# Altium footprint library connectors_USB_ETH.PcbLib: 71 footprints (part 3 of 5)
Each footprint in its own frame and in the unit in brackets; x right, y up, seen from the top. Pads: shape width x height; smd on the part's side, far side on the other; paste and mask are expansions set on the pad; w line width, h text height; cw(c..) or ccw(c..) is an arc to the next point about the centre after c.
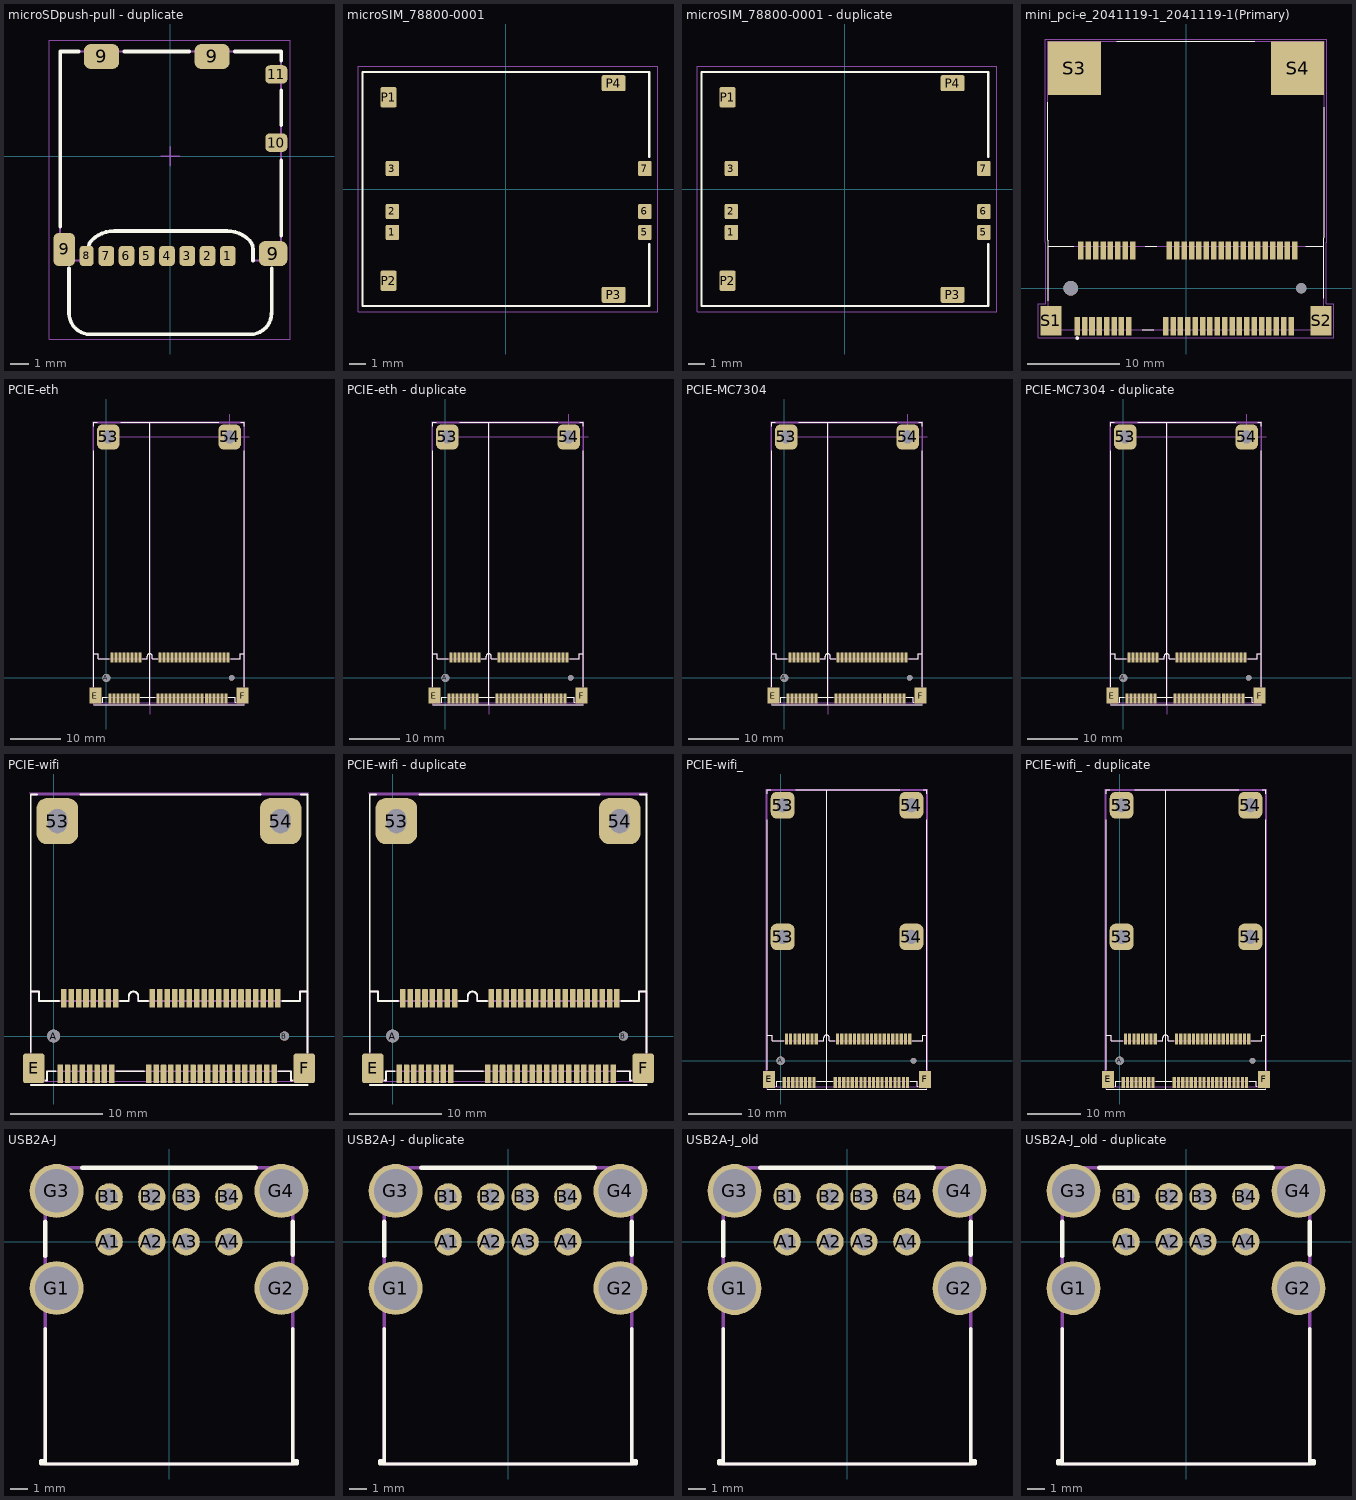
[diagram p2: the footprints below, top view; thin cyan lines are the x and y axes]

## microSDpush-pull - duplicate [mm] "1040310811 molex"
height 1.75
pads (14):
  rrect50% 0.85x1.1 smd: 1(3.123,-5.412) 2(2.023,-5.412) 3(0.923,-5.412) 4(-0.178,-5.412) 5(-1.278,-5.412) 6(-2.378,-5.412) 7(-3.478,-5.412)
  rrect50% 0.75x1.1 smd: 8(-4.543,-5.412)
  rrect50% 1.17x1.8 smd: 9(-5.757,-5.062)
  rrect50% 1.9x1.35 smd: 9(-3.732,5.413) 9(2.268,5.413)
  rrect50% 1.55x1.35 smd: 9(5.583,-5.288)
  rrect50% 1.2x1 smd: 10(5.758,0.738) 11(5.758,4.437)
Top Overlay:
  lines w0.2: -5.983,-3.812 -5.983,5.687 -4.982,5.687 ; -5.5,-8.575 -5.5,-6.1 ; -5.496,-8.525 ccw(c-4.346,-8.525) -4.346,-9.675 ; -4.457,-5.663 -4.457,-5.045 cw(c-3.775,-5.045) -4.257,-4.563 cw(c-3.05,-5.77) -3.05,-4.063 3.085,-4.063 cw(c3.085,-5.77) 4.293,-4.563 cw(c3.81,-5.045) 4.493,-5.045 4.493,-5.663 ; -4.4,-9.675 4.346,-9.675 ccw(c4.346,-8.525) 5.496,-8.525 ; -2.482,5.687 1.018,5.687 ; 3.518,5.687 6.018,5.687 6.018,5.188 ; 5.5,-8.575 5.5,-6.1 ; 6.018,-4.312 6.018,-0.212 ; 6.018,1.688 6.018,3.588
Mechanical 13:
  lines w0.1: -5.983,-5.663 -5.983,5.687 6.018,5.687 6.018,-5.663 ; -5.957,-5.663 -4.457,-5.663 -4.457,-5.045 cw(c-3.775,-5.045) -4.257,-4.563 cw(c-3.05,-5.77) -3.05,-4.063 3.11,-4.063 ; 3.085,-4.063 cw(c3.085,-5.77) 4.293,-4.563 cw(c3.81,-5.045) 4.493,-5.045 4.493,-5.663 5.993,-5.663
Mechanical 15:
  lines w0.05: -6.582,-9.925 -6.582,6.288 6.518,6.288 6.518,-9.925 -6.582,-9.925
  lines w0.1: -0.5,0 0.5,0 ; 0,-0.5 0,0.5
3D body "1040310811.stp": height 1.44, standoff -0.01, extent -5.957,-5.663 5.993,5.738

## microSIM_78800-0001 [mm] "MOLEX_78800-0001"
pads (10):
  rrect20% 0.8x0.9 smd: 1(-6.71,-2.57) 2(-6.71,-1.33) 3(-6.71,1.21) 5(8.23,-2.57) 6(8.23,-1.33) 7(8.23,1.21)
  rrect20% 0.95x1.2 smd: P1(-6.94,5.425) P2(-6.94,-5.425)
  rrect20% 1.4x0.95 smd: P3(6.37,-6.26) P4(6.37,6.26)
Top Overlay:
  lines w0.127: 8.48,-3.25 8.48,-6.925 -8.48,-6.925 -8.48,6.925 8.48,6.925 8.48,1.9
M1_3D_TOP:
  lines w0.05: -8.75,-7.25 -8.75,7.25 9,7.25 9,-7.25 -8.75,-7.25
3D body "788000001.stp": height 1.5, standoff -0.01, extent -8.48,-6.925 8.48,6.925

## microSIM_78800-0001 - duplicate [mm] "MOLEX_78800-0001"
pads (10):
  rrect20% 0.8x0.9 smd: 1(-6.71,-2.57) 2(-6.71,-1.33) 3(-6.71,1.21) 5(8.23,-2.57) 6(8.23,-1.33) 7(8.23,1.21)
  rrect20% 0.95x1.2 smd: P1(-6.94,5.425) P2(-6.94,-5.425)
  rrect20% 1.4x0.95 smd: P3(6.37,-6.26) P4(6.37,6.26)
Top Overlay:
  lines w0.127: 8.48,-3.25 8.48,-6.925 -8.48,-6.925 -8.48,6.925 8.48,6.925 8.48,1.9
M1_3D_TOP:
  lines w0.05: -8.75,-7.25 9,-7.25 9,7.25 -8.75,7.25 -8.75,-7.25
3D body "788000001.stp": height 1.5, standoff -0.01, extent -8.48,-6.925 8.48,6.925

## mini_pci-e_2041119-1_2041119-1(Primary) [mm] "2041119-1_2041119-1(Primary)"
pads (58):
  rect 0.6x2 smd: 1(-11.8,-4.1) 2(-11.4,4.1) 3(-11,-4.1) 4(-10.6,4.1) 5(-10.2,-4.1) 6(-9.8,4.1) 7(-9.4,-4.1) 8(-9,4.1) 9(-8.6,-4.1) 10(-8.2,4.1) 11(-7.8,-4.1) 12(-7.4,4.1) 13(-7,-4.1) 14(-6.6,4.1) 15(-6.2,-4.1) 16(-5.8,4.1) 17(-2.2,-4.1) 18(-1.8,4.1) 19(-1.4,-4.1) 20(-1,4.1) 21(-0.6,-4.1) 22(-0.2,4.1) 23(0.2,-4.1) 24(0.6,4.1) 25(1,-4.1) 26(1.4,4.1) 27(1.8,-4.1) 28(2.2,4.1) 29(2.6,-4.1) 30(3,4.1) 31(3.4,-4.1) 32(3.8,4.1) 33(4.2,-4.1) 34(4.6,4.1) 35(5,-4.1) 36(5.4,4.1) 37(5.8,-4.1) 38(6.2,4.1) 39(6.6,-4.1) 40(7,4.1) 41(7.4,-4.1) 42(7.8,4.1) 43(8.2,-4.1) 44(8.6,4.1) 45(9,-4.1) 46(9.4,4.1) 47(9.8,-4.1) 48(10.2,4.1) 49(10.6,-4.1) 50(11,4.1) 51(11.4,-4.1) 52(11.8,4.1)
  round 1.6 hole 1.6 unplated: None(-12.5,0)
  round 1.1 hole 1.1 unplated: None(12.5,0)
  rect 2.3x3.2 smd: S1(-14.65,-3.5) S2(14.65,-3.5)
  rect 5.8x5.8 smd: S3(-12.1,23.9) S4(12.1,23.9)
Top Overlay:
  circle w0.2: c-11.8,-5.4 r0.1
  lines w0.127: -15,20.2 -15,5.2 -14.95,5.15 -14.95,4.58 ; -14.95,-1.35 -14.95,4.58 ; -12.2,4.58 -14.95,4.58 ; -7.5,26.8 7.45,26.8 ; -4.75,-4.51 -3.5,-4.51 ; -4.4,4.58 -3.15,4.58 ; 13,4.58 14.95,4.58 ; 14.95,-1.1 14.95,4.58 ; 15,19.65 15,5.55 14.95,5.5 14.95,4.58
M1_3D_TOP:
  lines w0.05: -16.05,-5.35 -16.05,-1.65 -15.2,-1.65 -15.2,5 -15.25,5 -15.25,27.05 15.25,27.05 15.25,5 15.2,5 15.2,-1.65 16.05,-1.65 16.05,-5.35 -16.05,-5.35
  lines w0.127: -15,5.6 -15,26.8 15,26.8 15,5.6 ; -14.95,-4.51 14.95,-4.51 14.95,4.58 -14.95,4.58 -14.95,-4.51

## PCIE-eth [mil]
height 1
pads (60):
  rect 23.6x80 smd mask+5.4: 1(27.6,-161) 2(43.3,161) 3(59.1,-161) 4(74.8,161) 5(90.6,-161) 6(106.3,161) 7(122,-161) 8(137.8,161) 9(153.5,-161) 10(169.3,161) 11(185,-161) 12(200.8,161) 13(216.5,-161) 14(232.3,161) 15(248,-161) 16(263.8,161) 17(405.5,-161) 18(421.3,161) 19(437,-161) 20(452.8,161) 21(468.5,-161) 22(484.3,161) 23(500,-161) 24(515.7,161) 25(531.5,-161) 26(547.2,161) 27(563,-161) 28(578.7,161) 29(594.5,-161) 30(610.2,161) 31(626,-161) 32(641.7,161) 33(657.5,-161) 34(673.2,161) 35(689,-161) 36(704.7,161) 37(720,-161) 38(736.2,161) 39(752,-161) 40(767.7,161) 41(785,-161) 42(799.2,161) 43(815,-161) 44(830.7,161) 45(846.5,-161) 46(862.2,161) 47(878,-161) 48(893.7,161) 49(909.4,-161) 50(925.2,161) 51(940.9,-161) 52(956.7,161)
  rrect50% 177.17x196.85 hole 82.68 slot 102.36 at 90 deg mask+5: 53(15.75,1891.73) 54(968.5,1891.73)
  round 63 hole 63 mask+5: A(0,0)
  round 43 hole 43 mask+5: B(984.25,0)
  rect 90.55x126 smd mask+5: E(-85,-138) F(1069,-138)
  round 0 all layers, no hole: K(16,1892) L(969,1892)
Top Overlay:
  lines w7.87: 320.55,150.55 320.55,171 ; 360.55,150 360.55,171
  lines w8: -98,-209 1083,-209 ; -98,-68 -98,1785 ; -98,190 -62,190 -62,150 22,150 ; -98,1976.38 -98,2006 -70.87,2006 ; -33,-190 -29,-190 -29,-150 7,-150 ; 114.17,2006 881.89,2006 ; 267,-150 386,-150 ; 283,150 320,150 ; 320.55,171 cw(c340.55,170.2) 360.55,171 ; 341,-209 341,2003.94 ; 360.55,150 402,150 ; 959,-150 1012,-150 1012,-190 1016,-190 ; 976,150 1051,150 1051,190 1083,190 ; 1055.12,2006 1083,2006 1083,1976.38 ; 1083,-70 1083,1785
M1_3D_TOP:
  circle w8: c16,1892 r51.01
  circle w8: c968.5,1892 r51.01
  lines w1: -45,1892 1120,1892 ; 16,1827 16,1955 ; 968.5,1827 968.5,1955 ; 969,1802 969,2072 ; -104,-193 1088,-193 1088,2012 -104,2012 -104,-193
  lines w4: 341,-283 340.98,2003.94
  lines w8: -98,2006 1083,2006 ; 27,-190 27,-150 ; 43,151 43,197 ; 59,-189 59,-151 ; 75,151 75,197 ; 91,-189 91,-151 ; 106,150 106,197 ; 122,-189 122,-150 ; 138,150 138,197 ; 153,-190 153,-150 ; 169,150 169,197 ; 185,-190 185,-150 ; 201,150 201,197 ; 216,-189 216,-150 ; 232,150 232,197 ; 248,-189 248,-150 ; 264,150 264,197 ; 406,-189 406,-150 ; 421,150 421,197 ; 437,-189 437,-150 ; 453,150 453,197 ; 468,-189 468,-150 ; 484,150 484,197 ; 500,-189 500,-150 ; 516,150 516,197 ; 532,-190 532,-150 ; 547,150 547,197 ; 563,-189 563,-150 ; 579,151 579,197 ; 595,-189 595,-150 ; 610,150 610,197 ; 626,-189 626,-150 ; 642,151 642,197 ; 658,-190 658,-150 ; 673,150 673,197 ; 689,-189 689,-151 ; 704,150 704,197 ; 720,-189 720,-150 ; 736,150 736,197 ; 752,-189 752,-150 ; 768,150 768,197 ; 785,-189 785,-150 ; 799,150 799,197 ; 815,-189 815,-150 ; 831,150 831,197 ; 846,-189 846,-150 ; 862,150 862,197 ; 878,-189 878,-150 ; 894,150 894,197 ; 909,-189 909,-150 ; 925,150 925,197 ; 941,-189 941,-150 ; 956,150 956,197 ; -98,-209 -98,2003.94 1083,2003.94 1083,-209 -98,-209 ; -98,-190 -29,-190 -29,-150 1012,-150 1012,-190 1083,-190 1083,190 1051,190 1051,150 360,150 360,170 ccw(c340,170.1) 320,170 320,150 -62,150 -62,190 -98,190 -98,-190
3D body "PCI Express Mini Card (Full-Mini Card).step": height 291.34, standoff 104.33, extent -98.42,0 1082.68,2005.91
3D body: height 157.87, standoff 0.39, extent -52.81,1823.13 84.9,1960.88
3D body "c-2041119-1-c-3d.stp": height 159.45, standoff -23.62, extent -96.45,-181.1 1080.71,176.77
3D body "emile_maurin_394112X4.stp": height 270.83, standoff 47.24, extent -62.99,1813 94.49,1970.48
3D body "emile_maurin_394112X4.stp": height 98.43, standoff -125.16, extent -62.73,1813.26 94.75,1970.74
3D body "emile_maurin_394112X4.stp": height 98.43, standoff -125.16, extent 889.77,1813.26 1047.25,1970.74
3D body "emile_maurin_394112X4.stp": height 270.83, standoff 47.24, extent 889.52,1813 1047,1970.48
3D body: height 157.87, standoff 0.39, extent 899.69,1823.13 1037.4,1960.88

## PCIE-eth - duplicate [mil]
height 1
pads (60):
  rect 23.6x80 smd mask+5.4: 1(27.6,-161) 2(43.3,161) 3(59.1,-161) 4(74.8,161) 5(90.6,-161) 6(106.3,161) 7(122,-161) 8(137.8,161) 9(153.5,-161) 10(169.3,161) 11(185,-161) 12(200.8,161) 13(216.5,-161) 14(232.3,161) 15(248,-161) 16(263.8,161) 17(405.5,-161) 18(421.3,161) 19(437,-161) 20(452.8,161) 21(468.5,-161) 22(484.3,161) 23(500,-161) 24(515.7,161) 25(531.5,-161) 26(547.2,161) 27(563,-161) 28(578.7,161) 29(594.5,-161) 30(610.2,161) 31(626,-161) 32(641.7,161) 33(657.5,-161) 34(673.2,161) 35(689,-161) 36(704.7,161) 37(720,-161) 38(736.2,161) 39(752,-161) 40(767.7,161) 41(785,-161) 42(799.2,161) 43(815,-161) 44(830.7,161) 45(846.5,-161) 46(862.2,161) 47(878,-161) 48(893.7,161) 49(909.4,-161) 50(925.2,161) 51(940.9,-161) 52(956.7,161)
  rrect50% 177.17x196.85 hole 82.68 slot 102.36 at 90 deg mask+5: 53(15.75,1891.73) 54(968.5,1891.73)
  round 63 hole 63 mask+5: A(0,0)
  round 43 hole 43 mask+5: B(984.25,0)
  rect 90.55x126 smd mask+5: E(-85,-138) F(1069,-138)
  round 0 all layers, no hole: K(16,1892) L(969,1892)
Top Overlay:
  lines w7.87: 320.55,150.55 320.55,171 ; 360.55,150 360.55,171
  lines w8: -98,-209 1083,-209 ; -98,-68 -98,1785 ; -98,190 -62,190 -62,150 22,150 ; -98,1976.38 -98,2006 -70.87,2006 ; -33,-190 -29,-190 -29,-150 7,-150 ; 114.17,2006 881.89,2006 ; 267,-150 386,-150 ; 283,150 320,150 ; 320.55,171 cw(c340.55,170.2) 360.55,171 ; 341,-209 341,2003.94 ; 360.55,150 402,150 ; 959,-150 1012,-150 1012,-190 1016,-190 ; 976,150 1051,150 1051,190 1083,190 ; 1055.12,2006 1083,2006 1083,1976.38 ; 1083,-70 1083,1785
M1_3D_TOP:
  circle w8: c968.5,1892 r51.01
  circle w8: c16,1892 r51.01
  lines w1: -45,1892 1120,1892 ; 16,1827 16,1955 ; 968.5,1827 968.5,1955 ; 969,1802 969,2072 ; -104,-193 -104,2012 1088,2012 1088,-193 -104,-193
  lines w4: 341,-283 340.98,2003.94
  lines w8: -98,2006 1083,2006 ; 27,-190 27,-150 ; 43,151 43,197 ; 59,-189 59,-151 ; 75,151 75,197 ; 91,-189 91,-151 ; 106,150 106,197 ; 122,-189 122,-150 ; 138,150 138,197 ; 153,-190 153,-150 ; 169,150 169,197 ; 185,-190 185,-150 ; 201,150 201,197 ; 216,-189 216,-150 ; 232,150 232,197 ; 248,-189 248,-150 ; 264,150 264,197 ; 406,-189 406,-150 ; 421,150 421,197 ; 437,-189 437,-150 ; 453,150 453,197 ; 468,-189 468,-150 ; 484,150 484,197 ; 500,-189 500,-150 ; 516,150 516,197 ; 532,-190 532,-150 ; 547,150 547,197 ; 563,-189 563,-150 ; 579,151 579,197 ; 595,-189 595,-150 ; 610,150 610,197 ; 626,-189 626,-150 ; 642,151 642,197 ; 658,-190 658,-150 ; 673,150 673,197 ; 689,-189 689,-151 ; 704,150 704,197 ; 720,-189 720,-150 ; 736,150 736,197 ; 752,-189 752,-150 ; 768,150 768,197 ; 785,-189 785,-150 ; 799,150 799,197 ; 815,-189 815,-150 ; 831,150 831,197 ; 846,-189 846,-150 ; 862,150 862,197 ; 878,-189 878,-150 ; 894,150 894,197 ; 909,-189 909,-150 ; 925,150 925,197 ; 941,-189 941,-150 ; 956,150 956,197 ; -98,-209 1083,-209 1083,2003.94 -98,2003.94 -98,-209 ; -98,-190 -98,190 -62,190 -62,150 320,150 320,170 cw(c340,170.1) 360,170 360,150 1051,150 1051,190 1083,190 1083,-190 1012,-190 1012,-150 -29,-150 -29,-190 -98,-190
3D body: height 157.87, standoff 0.39, extent 899.69,1823.13 1037.4,1960.88
3D body "emile_maurin_394112X4.stp": height 270.83, standoff 47.24, extent 889.52,1813 1047,1970.48
3D body "emile_maurin_394112X4.stp": height 98.43, standoff -125.16, extent 889.77,1813.26 1047.25,1970.74
3D body "emile_maurin_394112X4.stp": height 98.43, standoff -125.16, extent -62.73,1813.26 94.75,1970.74
3D body "emile_maurin_394112X4.stp": height 270.83, standoff 47.24, extent -62.99,1813 94.49,1970.48
3D body "c-2041119-1-c-3d.stp": height 159.45, standoff -23.62, extent -96.45,-181.1 1080.71,176.77
3D body: height 157.87, standoff 0.39, extent -52.81,1823.13 84.9,1960.88
3D body "PCI Express Mini Card (Full-Mini Card).step": height 291.34, standoff 104.33, extent -98.42,0 1082.68,2005.91

## PCIE-MC7304 [mil]
height 1
pads (60):
  rect 23.6x80 smd mask+5.4: 1(27.6,-161) 2(43.3,161) 3(59.1,-161) 4(74.8,161) 5(90.6,-161) 6(106.3,161) 7(122,-161) 8(137.8,161) 9(153.5,-161) 10(169.3,161) 11(185,-161) 12(200.8,161) 13(216.5,-161) 14(232.3,161) 15(248,-161) 16(263.8,161) 17(405.5,-161) 18(421.3,161) 19(437,-161) 20(452.8,161) 21(468.5,-161) 22(484.3,161) 23(500,-161) 24(515.7,161) 25(531.5,-161) 26(547.2,161) 27(563,-161) 28(578.7,161) 29(594.5,-161) 30(610.2,161) 31(626,-161) 32(641.7,161) 33(657.5,-161) 34(673.2,161) 35(689,-161) 36(704.7,161) 37(720,-161) 38(736.2,161) 39(752,-161) 40(767.7,161) 41(785,-161) 42(799.2,161) 43(815,-161) 44(830.7,161) 45(846.5,-161) 46(862.2,161) 47(878,-161) 48(893.7,161) 49(909.4,-161) 50(925.2,161) 51(940.9,-161) 52(956.7,161)
  rrect50% 177.17x196.85 hole 82.68 slot 102.36 at 90 deg mask+5: 53(15.75,1891.73) 54(968.5,1891.73)
  round 63 hole 63 unplated mask+5: A(0,0)
  round 43.31 hole 43.31 unplated mask+5: B(984.25,0)
  rect 90.55x126 smd mask+5: E(-85,-138) F(1069,-138)
  round 0 all layers, no hole: K(16,1892) L(969,1892)
Top Overlay:
  lines w7.87: 320.55,150.55 320.55,171 ; 360.55,150 360.55,171
  lines w8: -98,-209 1083,-209 ; -98,-68 -98,1785 ; -98,190 -62,190 -62,150 22,150 ; -98,1976.38 -98,2006 -70.87,2006 ; -33,-190 -29,-190 -29,-150 7,-150 ; 114.17,2006 881.89,2006 ; 267,-150 386,-150 ; 283,150 320,150 ; 320.55,171 cw(c340.55,170.2) 360.55,171 ; 341,-209 341,2003.94 ; 360.55,150 402,150 ; 959,-150 1012,-150 1012,-190 1016,-190 ; 976,150 1051,150 1051,190 1083,190 ; 1055.12,2006 1083,2006 1083,1976.38 ; 1083,-70 1083,1785
M1_3D_TOP:
  circle w8: c16,1892 r51.01
  circle w8: c968.5,1892 r51.01
  lines w1: -45,1892 1120,1892 ; 16,1827 16,1955 ; 968.5,1827 968.5,1955 ; 969,1802 969,2072 ; -104,-193 1088,-193 1088,2012 -104,2012 -104,-193
  lines w4: 341,-283 340.98,2003.94
  lines w8: -98,2006 1083,2006 ; 27,-190 27,-150 ; 43,151 43,197 ; 59,-189 59,-151 ; 75,151 75,197 ; 91,-189 91,-151 ; 106,150 106,197 ; 122,-189 122,-150 ; 138,150 138,197 ; 153,-190 153,-150 ; 169,150 169,197 ; 185,-190 185,-150 ; 201,150 201,197 ; 216,-189 216,-150 ; 232,150 232,197 ; 248,-189 248,-150 ; 264,150 264,197 ; 406,-189 406,-150 ; 421,150 421,197 ; 437,-189 437,-150 ; 453,150 453,197 ; 468,-189 468,-150 ; 484,150 484,197 ; 500,-189 500,-150 ; 516,150 516,197 ; 532,-190 532,-150 ; 547,150 547,197 ; 563,-189 563,-150 ; 579,151 579,197 ; 595,-189 595,-150 ; 610,150 610,197 ; 626,-189 626,-150 ; 642,151 642,197 ; 658,-190 658,-150 ; 673,150 673,197 ; 689,-189 689,-151 ; 704,150 704,197 ; 720,-189 720,-150 ; 736,150 736,197 ; 752,-189 752,-150 ; 768,150 768,197 ; 785,-189 785,-150 ; 799,150 799,197 ; 815,-189 815,-150 ; 831,150 831,197 ; 846,-189 846,-150 ; 862,150 862,197 ; 878,-189 878,-150 ; 894,150 894,197 ; 909,-189 909,-150 ; 925,150 925,197 ; 941,-189 941,-150 ; 956,150 956,197 ; -98,-209 -98,2003.94 1083,2003.94 1083,-209 -98,-209 ; -98,-190 -29,-190 -29,-150 1012,-150 1012,-190 1083,-190 1083,190 1051,190 1051,150 360,150 360,170 ccw(c340,170.1) 320,170 320,150 -62,150 -62,190 -98,190 -98,-190
3D body: height 157.87, standoff 0.39, extent -52.81,1823.13 84.9,1960.88
3D body "MC7355_Assy_042612.stp": height 265.75, standoff 161.02, extent -96.21,0.27 1080.96,2002.24
3D body "c-2041119-1-c-3d.stp": height 159.45, standoff -23.62, extent -96.45,-181.1 1080.71,176.77
3D body "emile_maurin_394112X4.stp": height 270.83, standoff 47.24, extent -62.99,1813 94.49,1970.48
3D body "emile_maurin_394112X4.stp": height 98.43, standoff -125.16, extent -62.73,1813.26 94.75,1970.74
3D body "emile_maurin_394112X4.stp": height 98.43, standoff -125.16, extent 889.77,1813.26 1047.25,1970.74
3D body "emile_maurin_394112X4.stp": height 270.83, standoff 47.24, extent 889.52,1813 1047,1970.48
3D body: height 157.87, standoff 0.39, extent 899.69,1823.13 1037.4,1960.88

## PCIE-MC7304 - duplicate [mil]
height 1
pads (60):
  rect 23.6x80 smd mask+5.4: 1(27.6,-161) 2(43.3,161) 3(59.1,-161) 4(74.8,161) 5(90.6,-161) 6(106.3,161) 7(122,-161) 8(137.8,161) 9(153.5,-161) 10(169.3,161) 11(185,-161) 12(200.8,161) 13(216.5,-161) 14(232.3,161) 15(248,-161) 16(263.8,161) 17(405.5,-161) 18(421.3,161) 19(437,-161) 20(452.8,161) 21(468.5,-161) 22(484.3,161) 23(500,-161) 24(515.7,161) 25(531.5,-161) 26(547.2,161) 27(563,-161) 28(578.7,161) 29(594.5,-161) 30(610.2,161) 31(626,-161) 32(641.7,161) 33(657.5,-161) 34(673.2,161) 35(689,-161) 36(704.7,161) 37(720,-161) 38(736.2,161) 39(752,-161) 40(767.7,161) 41(785,-161) 42(799.2,161) 43(815,-161) 44(830.7,161) 45(846.5,-161) 46(862.2,161) 47(878,-161) 48(893.7,161) 49(909.4,-161) 50(925.2,161) 51(940.9,-161) 52(956.7,161)
  rrect50% 177.17x196.85 hole 82.68 slot 102.36 at 90 deg mask+5: 53(15.75,1891.73) 54(968.5,1891.73)
  round 63 hole 63 unplated mask+5: A(0,0)
  round 43.31 hole 43.31 unplated mask+5: B(984.25,0)
  rect 90.55x126 smd mask+5: E(-85,-138) F(1069,-138)
  round 0 all layers, no hole: K(16,1892) L(969,1892)
Top Overlay:
  lines w7.87: 320.55,150.55 320.55,171 ; 360.55,150 360.55,171
  lines w8: -98,-209 1083,-209 ; -98,-68 -98,1785 ; -98,190 -62,190 -62,150 22,150 ; -98,1976.38 -98,2006 -70.87,2006 ; -33,-190 -29,-190 -29,-150 7,-150 ; 114.17,2006 881.89,2006 ; 267,-150 386,-150 ; 283,150 320,150 ; 320.55,171 cw(c340.55,170.2) 360.55,171 ; 341,-209 341,2003.94 ; 360.55,150 402,150 ; 959,-150 1012,-150 1012,-190 1016,-190 ; 976,150 1051,150 1051,190 1083,190 ; 1055.12,2006 1083,2006 1083,1976.38 ; 1083,-70 1083,1785
M1_3D_TOP:
  circle w8: c968.5,1892 r51.01
  circle w8: c16,1892 r51.01
  lines w1: -45,1892 1120,1892 ; 16,1827 16,1955 ; 968.5,1827 968.5,1955 ; 969,1802 969,2072 ; -104,-193 -104,2012 1088,2012 1088,-193 -104,-193
  lines w4: 341,-283 340.98,2003.94
  lines w8: -98,2006 1083,2006 ; 27,-190 27,-150 ; 43,151 43,197 ; 59,-189 59,-151 ; 75,151 75,197 ; 91,-189 91,-151 ; 106,150 106,197 ; 122,-189 122,-150 ; 138,150 138,197 ; 153,-190 153,-150 ; 169,150 169,197 ; 185,-190 185,-150 ; 201,150 201,197 ; 216,-189 216,-150 ; 232,150 232,197 ; 248,-189 248,-150 ; 264,150 264,197 ; 406,-189 406,-150 ; 421,150 421,197 ; 437,-189 437,-150 ; 453,150 453,197 ; 468,-189 468,-150 ; 484,150 484,197 ; 500,-189 500,-150 ; 516,150 516,197 ; 532,-190 532,-150 ; 547,150 547,197 ; 563,-189 563,-150 ; 579,151 579,197 ; 595,-189 595,-150 ; 610,150 610,197 ; 626,-189 626,-150 ; 642,151 642,197 ; 658,-190 658,-150 ; 673,150 673,197 ; 689,-189 689,-151 ; 704,150 704,197 ; 720,-189 720,-150 ; 736,150 736,197 ; 752,-189 752,-150 ; 768,150 768,197 ; 785,-189 785,-150 ; 799,150 799,197 ; 815,-189 815,-150 ; 831,150 831,197 ; 846,-189 846,-150 ; 862,150 862,197 ; 878,-189 878,-150 ; 894,150 894,197 ; 909,-189 909,-150 ; 925,150 925,197 ; 941,-189 941,-150 ; 956,150 956,197 ; -98,-209 1083,-209 1083,2003.94 -98,2003.94 -98,-209 ; -98,-190 -98,190 -62,190 -62,150 320,150 320,170 cw(c340,170.1) 360,170 360,150 1051,150 1051,190 1083,190 1083,-190 1012,-190 1012,-150 -29,-150 -29,-190 -98,-190
3D body: height 157.87, standoff 0.39, extent 899.69,1823.13 1037.4,1960.88
3D body "emile_maurin_394112X4.stp": height 270.83, standoff 47.24, extent 889.52,1813 1047,1970.48
3D body "emile_maurin_394112X4.stp": height 98.43, standoff -125.16, extent 889.77,1813.26 1047.25,1970.74
3D body "emile_maurin_394112X4.stp": height 98.43, standoff -125.16, extent -62.73,1813.26 94.75,1970.74
3D body "emile_maurin_394112X4.stp": height 270.83, standoff 47.24, extent -62.99,1813 94.49,1970.48
3D body "c-2041119-1-c-3d.stp": height 159.45, standoff -23.62, extent -96.45,-181.1 1080.71,176.77
3D body "MC7355_Assy_042612.stp": height 265.75, standoff 161.02, extent -96.21,0.27 1080.96,2002.24
3D body: height 157.87, standoff 0.39, extent -52.81,1823.13 84.9,1960.88

## PCIE-wifi [mil]
height 1
pads (58):
  rrect20% 23.6x80 smd mask+5.4: 1(27.6,-161) 2(43.3,161) 3(59.1,-161) 4(74.8,161) 5(90.6,-161) 6(106.3,161) 7(122,-161) 8(137.8,161) 9(153.5,-161) 10(169.3,161) 11(185,-161) 12(200.8,161) 13(216.5,-161) 14(232.3,161) 15(248,-161) 16(263.8,161) 17(405.5,-161) 18(421.3,161) 19(437,-161) 20(452.8,161) 21(468.5,-161) 22(484.3,161) 23(500,-161) 24(515.7,161) 25(531.5,-161) 26(547.2,161) 27(563,-161) 28(578.7,161) 29(594.5,-161) 30(610.2,161) 31(626,-161) 32(641.7,161) 33(657.5,-161) 34(673.2,161) 35(689,-161) 36(704.7,161) 37(720,-161) 38(736.2,161) 39(752,-161) 40(767.7,161) 41(785,-161) 42(799.2,161) 43(815,-161) 44(830.7,161) 45(846.5,-161) 46(862.2,161) 47(878,-161) 48(893.7,161) 49(909.4,-161) 50(925.2,161) 51(940.9,-161) 52(956.7,161)
  rrect50% 177.17x196.85 hole 82.68 slot 102.36 at 90 deg mask+5: 53(15.75,917.32) 54(968.5,917.32)
  round 55.12 hole 55.12 unplated mask+5: A(0,0)
  round 39.37 hole 39.37 unplated mask+5: B(984.25,0)
  rrect20% 90.55x126 smd mask+5: E(-85,-138) F(1069,-138)
Top Overlay:
  lines w7.87: 320.55,150.55 320.55,171 ; 360.55,150 360.55,171
  lines w8: -98,-209 1083,-209 ; -98,-68 -98,1031.5 ; -98,190 -62,190 -62,150 22,150 ; -98,1001.97 -98,1031.59 -70.86,1031.59 ; -33,-190 -29,-190 -29,-150 7,-150 ; 114.17,1031.59 881.89,1031.59 ; 267,-150 386,-150 ; 283,150 320,150 ; 320.55,171 cw(c340.55,170.2) 360.55,171 ; 360.55,150 402,150 ; 959,-150 1012,-150 1012,-190 1016,-190 ; 976,150 1051,150 1051,190 1083,190 ; 1055.12,1031.59 1083,1031.59 ; 1083,-70 1083,1031.59 ; 1083,1001.97 1083,1031.59
M1_3D_TOP:
  circle w8: c16,917.32 r51.01
  circle w8: c968.5,917.32 r51.01
  lines w1: -104,-193 1088,-193 ; -104,1037.59 1088,1037.59 ; 16,852.32 16,980.32 ; 968.5,852.32 968.5,980.32
  lines w8: -98,-209 1083,-209 ; -98,1029.53 1083,1029.53 ; -98,1031.59 1083,1031.59 ; 27,-190 27,-150 ; 43,151 43,197 ; 59,-189 59,-151 ; 75,151 75,197 ; 91,-189 91,-151 ; 106,150 106,197 ; 122,-189 122,-150 ; 138,150 138,197 ; 153,-190 153,-150 ; 169,150 169,197 ; 185,-190 185,-150 ; 201,150 201,197 ; 216,-189 216,-150 ; 232,150 232,197 ; 248,-189 248,-150 ; 264,150 264,197 ; 406,-189 406,-150 ; 421,150 421,197 ; 437,-189 437,-150 ; 453,150 453,197 ; 468,-189 468,-150 ; 484,150 484,197 ; 500,-189 500,-150 ; 516,150 516,197 ; 532,-190 532,-150 ; 547,150 547,197 ; 563,-189 563,-150 ; 579,151 579,197 ; 595,-189 595,-150 ; 610,150 610,197 ; 626,-189 626,-150 ; 642,151 642,197 ; 658,-190 658,-150 ; 673,150 673,197 ; 689,-189 689,-151 ; 704,150 704,197 ; 720,-189 720,-150 ; 736,150 736,197 ; 752,-189 752,-150 ; 768,150 768,197 ; 785,-189 785,-150 ; 799,150 799,197 ; 815,-189 815,-150 ; 831,150 831,197 ; 846,-189 846,-150 ; 862,150 862,197 ; 878,-189 878,-150 ; 894,150 894,197 ; 909,-189 909,-150 ; 925,150 925,197 ; 941,-189 941,-150 ; 956,150 956,197 ; -98,-190 -29,-190 -29,-150 1012,-150 1012,-190 1083,-190 1083,190 1051,190 1051,150 360,150 360,170 ccw(c340,170.1) 320,170 320,150 -62,150 -62,190 -98,190 -98,-190
3D body "AS0B22x-S68Q-7H_317-0000-2034-B-3D.step": height 267.72, standoff -23.62, extent -96.45,-185.06 1080.71,177.19
3D body: height 157.87, standoff 0.39, extent -52.81,848.45 84.9,986.21
3D body "emile_maurin_394112X4.stp": height 270.83, standoff 47.24, extent -62.99,838.32 94.49,995.8
3D body "emile_maurin_394112X4.stp": height 98.43, standoff -125.16, extent -62.73,838.59 94.75,996.07
3D body "emile_maurin_394112X4.stp": height 98.43, standoff -125.16, extent 889.77,838.59 1047.25,996.07
3D body "emile_maurin_394112X4.stp": height 270.83, standoff 47.24, extent 889.52,838.32 1047,995.8
3D body: height 157.87, standoff 0.39, extent 899.69,848.45 1037.4,986.21
3D body "PCI Express Half-Mini Card.step": height 291.34, standoff 104.33, extent -98.42,-23.62 1082.68,1031.5

## PCIE-wifi - duplicate [mil]
height 1
pads (58):
  rrect20% 23.6x80 smd mask+5.4: 1(27.6,-161) 2(43.3,161) 3(59.1,-161) 4(74.8,161) 5(90.6,-161) 6(106.3,161) 7(122,-161) 8(137.8,161) 9(153.5,-161) 10(169.3,161) 11(185,-161) 12(200.8,161) 13(216.5,-161) 14(232.3,161) 15(248,-161) 16(263.8,161) 17(405.5,-161) 18(421.3,161) 19(437,-161) 20(452.8,161) 21(468.5,-161) 22(484.3,161) 23(500,-161) 24(515.7,161) 25(531.5,-161) 26(547.2,161) 27(563,-161) 28(578.7,161) 29(594.5,-161) 30(610.2,161) 31(626,-161) 32(641.7,161) 33(657.5,-161) 34(673.2,161) 35(689,-161) 36(704.7,161) 37(720,-161) 38(736.2,161) 39(752,-161) 40(767.7,161) 41(785,-161) 42(799.2,161) 43(815,-161) 44(830.7,161) 45(846.5,-161) 46(862.2,161) 47(878,-161) 48(893.7,161) 49(909.4,-161) 50(925.2,161) 51(940.9,-161) 52(956.7,161)
  rrect50% 177.17x196.85 hole 82.68 slot 102.36 at 90 deg mask+5: 53(15.75,917.32) 54(968.5,917.32)
  round 55.12 hole 55.12 unplated mask+5: A(0,0)
  round 39.37 hole 39.37 unplated mask+5: B(984.25,0)
  rrect20% 90.55x126 smd mask+5: E(-85,-138) F(1069,-138)
Top Overlay:
  lines w7.87: 320.55,150.55 320.55,171 ; 360.55,150 360.55,171
  lines w8: -98,-209 1083,-209 ; -98,-68 -98,1031.5 ; -98,190 -62,190 -62,150 22,150 ; -98,1001.97 -98,1031.59 -70.86,1031.59 ; -33,-190 -29,-190 -29,-150 7,-150 ; 114.17,1031.59 881.89,1031.59 ; 267,-150 386,-150 ; 283,150 320,150 ; 320.55,171 cw(c340.55,170.2) 360.55,171 ; 360.55,150 402,150 ; 959,-150 1012,-150 1012,-190 1016,-190 ; 976,150 1051,150 1051,190 1083,190 ; 1055.12,1031.59 1083,1031.59 ; 1083,-70 1083,1031.59 ; 1083,1001.97 1083,1031.59
M1_3D_TOP:
  circle w8: c16,917.32 r51.01
  circle w8: c968.5,917.32 r51.01
  lines w1: -104,-193 1088,-193 ; -104,1037.59 1088,1037.59 ; 16,852.32 16,980.32 ; 968.5,852.32 968.5,980.32
  lines w8: -98,-209 1083,-209 ; -98,1029.53 1083,1029.53 ; -98,1031.59 1083,1031.59 ; 27,-190 27,-150 ; 43,151 43,197 ; 59,-189 59,-151 ; 75,151 75,197 ; 91,-189 91,-151 ; 106,150 106,197 ; 122,-189 122,-150 ; 138,150 138,197 ; 153,-190 153,-150 ; 169,150 169,197 ; 185,-190 185,-150 ; 201,150 201,197 ; 216,-189 216,-150 ; 232,150 232,197 ; 248,-189 248,-150 ; 264,150 264,197 ; 406,-189 406,-150 ; 421,150 421,197 ; 437,-189 437,-150 ; 453,150 453,197 ; 468,-189 468,-150 ; 484,150 484,197 ; 500,-189 500,-150 ; 516,150 516,197 ; 532,-190 532,-150 ; 547,150 547,197 ; 563,-189 563,-150 ; 579,151 579,197 ; 595,-189 595,-150 ; 610,150 610,197 ; 626,-189 626,-150 ; 642,151 642,197 ; 658,-190 658,-150 ; 673,150 673,197 ; 689,-189 689,-151 ; 704,150 704,197 ; 720,-189 720,-150 ; 736,150 736,197 ; 752,-189 752,-150 ; 768,150 768,197 ; 785,-189 785,-150 ; 799,150 799,197 ; 815,-189 815,-150 ; 831,150 831,197 ; 846,-189 846,-150 ; 862,150 862,197 ; 878,-189 878,-150 ; 894,150 894,197 ; 909,-189 909,-150 ; 925,150 925,197 ; 941,-189 941,-150 ; 956,150 956,197 ; -98,-190 -29,-190 -29,-150 1012,-150 1012,-190 1083,-190 1083,190 1051,190 1051,150 360,150 360,170 ccw(c340,170.1) 320,170 320,150 -62,150 -62,190 -98,190 -98,-190
3D body "AS0B22x-S68Q-7H_317-0000-2034-B-3D.step": height 267.72, standoff -23.62, extent -96.45,-185.06 1080.71,177.19
3D body: height 157.87, standoff 0.39, extent -52.81,848.45 84.9,986.21
3D body "emile_maurin_394112X4.stp": height 270.83, standoff 47.24, extent -62.99,838.32 94.49,995.8
3D body "emile_maurin_394112X4.stp": height 98.43, standoff -125.16, extent -62.73,838.59 94.75,996.07
3D body "emile_maurin_394112X4.stp": height 98.43, standoff -125.16, extent 889.77,838.59 1047.25,996.07
3D body "emile_maurin_394112X4.stp": height 270.83, standoff 47.24, extent 889.52,838.32 1047,995.8
3D body: height 157.87, standoff 0.39, extent 899.69,848.45 1037.4,986.21
3D body "PCI Express Half-Mini Card.step": height 291.34, standoff 104.33, extent -98.42,-23.62 1082.68,1031.5

## PCIE-wifi_ [mil]
height 1
pads (62):
  rect 23.6x80 smd mask+5.4: 1(27.6,-161) 2(43.3,161) 3(59.1,-161) 4(74.8,161) 5(90.6,-161) 6(106.3,161) 7(122,-161) 8(137.8,161) 9(153.5,-161) 10(169.3,161) 11(185,-161) 12(200.8,161) 13(216.5,-161) 14(232.3,161) 15(248,-161) 16(263.8,161) 17(405.5,-161) 18(421.3,161) 19(437,-161) 20(452.8,161) 21(468.5,-161) 22(484.3,161) 23(500,-161) 24(515.7,161) 25(531.5,-161) 26(547.2,161) 27(563,-161) 28(578.7,161) 29(594.5,-161) 30(610.2,161) 31(626,-161) 32(641.7,161) 33(657.5,-161) 34(673.2,161) 35(689,-161) 36(704.7,161) 37(720,-161) 38(736.2,161) 39(752,-161) 40(767.7,161) 41(785,-161) 42(799.2,161) 43(815,-161) 44(830.7,161) 45(846.5,-161) 46(862.2,161) 47(878,-161) 48(893.7,161) 49(909.4,-161) 50(925.2,161) 51(940.9,-161) 52(956.7,161)
  rrect50% 177.17x196.85 hole 82.68 slot 102.36 at 90 deg mask+5: 53(15.75,917.32) 53(15.75,1891.73) 54(968.5,917.32) 54(968.5,1891.73)
  round 63 hole 63 mask+5: A(0,0)
  round 43 hole 43 mask+5: B(984.25,0)
  rect 90.55x126 smd mask+5: E(-85,-138) F(1069,-138)
  round 0 all layers, no hole: K(16,1892) L(969,1892)
Top Overlay:
  lines w7.87: 320.55,150.55 320.55,171 ; 360.55,150 360.55,171
  lines w8: -98,-209 1083,-209 ; -98,-68 -98,1785 ; -98,190 -62,190 -62,150 22,150 ; -98,1976.38 -98,2006 -70.87,2006 ; -33,-190 -29,-190 -29,-150 7,-150 ; 114.17,2006 881.89,2006 ; 267,-150 386,-150 ; 283,150 320,150 ; 320.55,171 cw(c340.55,170.2) 360.55,171 ; 341,-209 341,2007 ; 360.55,150 402,150 ; 959,-150 1012,-150 1012,-190 1016,-190 ; 976,150 1051,150 1051,190 1083,190 ; 1055.12,2006 1083,2006 1083,1976.38 ; 1083,-70 1083,1785
M1_3D_TOP:
  circle w8: c16,917.32 r51.01
  circle w8: c968.5,917.32 r51.01
  circle w8: c16.25,1892 r51.01
  circle w8: c968.76,1892 r51.01
  lines w1: 16,852.32 16,980.32 ; 16.25,1827 16.25,1955 ; 968.5,852.32 968.5,980.32 ; 968.76,1827 968.76,1955 ; -104,-193 1088,-193 1088,2012 -104,2012 -104,-193
  lines w8: -98,2006 1083,2006 ; 27,-190 27,-150 ; 43,151 43,197 ; 59,-189 59,-151 ; 75,151 75,197 ; 91,-189 91,-151 ; 106,150 106,197 ; 122,-189 122,-150 ; 138,150 138,197 ; 153,-190 153,-150 ; 169,150 169,197 ; 185,-190 185,-150 ; 201,150 201,197 ; 216,-189 216,-150 ; 232,150 232,197 ; 248,-189 248,-150 ; 264,150 264,197 ; 406,-189 406,-150 ; 421,150 421,197 ; 437,-189 437,-150 ; 453,150 453,197 ; 468,-189 468,-150 ; 484,150 484,197 ; 500,-189 500,-150 ; 516,150 516,197 ; 532,-190 532,-150 ; 547,150 547,197 ; 563,-189 563,-150 ; 579,151 579,197 ; 595,-189 595,-150 ; 610,150 610,197 ; 626,-189 626,-150 ; 642,151 642,197 ; 658,-190 658,-150 ; 673,150 673,197 ; 689,-189 689,-151 ; 704,150 704,197 ; 720,-189 720,-150 ; 736,150 736,197 ; 752,-189 752,-150 ; 768,150 768,197 ; 785,-189 785,-150 ; 799,150 799,197 ; 815,-189 815,-150 ; 831,150 831,197 ; 846,-189 846,-150 ; 862,150 862,197 ; 878,-189 878,-150 ; 894,150 894,197 ; 909,-189 909,-150 ; 925,150 925,197 ; 941,-189 941,-150 ; 956,150 956,197 ; -98,-209 -98,2003.94 1083,2003.94 1083,-209 -98,-209 ; -98,-190 -29,-190 -29,-150 1012,-150 1012,-190 1083,-190 1083,190 1051,190 1051,150 360,150 360,170 ccw(c340,170.1) 320,170 320,150 -62,150 -62,190 -98,190 -98,-190
3D body: height 157.87, standoff 0.39, extent -52.81,848.45 84.9,986.21
3D body "emile_maurin_394112X4.stp": height 270.83, standoff 47.24, extent -62.99,838.32 94.49,995.8
3D body "emile_maurin_394112X4.stp": height 98.43, standoff -125.16, extent -62.73,838.59 94.75,996.07
3D body "emile_maurin_394112X4.stp": height 98.43, standoff -125.16, extent 889.77,838.59 1047.25,996.07
3D body "emile_maurin_394112X4.stp": height 270.83, standoff 47.24, extent 889.52,838.32 1047,995.8
3D body: height 157.87, standoff 0.39, extent 899.69,848.45 1037.4,986.21
3D body: height 157.87, standoff 0.39, extent -52.56,1823.13 85.15,1960.88
3D body "emile_maurin_394112X4.stp": height 270.83, standoff 47.24, extent -62.73,1813 94.74,1970.48
3D body "emile_maurin_394112X4.stp": height 98.43, standoff -125.16, extent -62.48,1813.26 95,1970.74
3D body "emile_maurin_394112X4.stp": height 98.43, standoff -125.16, extent 890.02,1813.26 1047.5,1970.74
3D body "emile_maurin_394112X4.stp": height 270.83, standoff 47.24, extent 889.77,1813 1047.25,1970.48
3D body: height 157.87, standoff 0.39, extent 899.95,1823.13 1037.66,1960.88
3D body "PCI Express Half-Mini Card.step": height 291.34, standoff 104.33, extent -98.42,-23.62 1082.68,1031.5
3D body "c-2041119-1-c-3d.stp": height 159.45, standoff -23.62, extent -96.45,-181.1 1080.71,176.77

## PCIE-wifi_ - duplicate [mil]
height 1
pads (62):
  rect 23.6x80 smd mask+5.4: 1(27.6,-161) 2(43.3,161) 3(59.1,-161) 4(74.8,161) 5(90.6,-161) 6(106.3,161) 7(122,-161) 8(137.8,161) 9(153.5,-161) 10(169.3,161) 11(185,-161) 12(200.8,161) 13(216.5,-161) 14(232.3,161) 15(248,-161) 16(263.8,161) 17(405.5,-161) 18(421.3,161) 19(437,-161) 20(452.8,161) 21(468.5,-161) 22(484.3,161) 23(500,-161) 24(515.7,161) 25(531.5,-161) 26(547.2,161) 27(563,-161) 28(578.7,161) 29(594.5,-161) 30(610.2,161) 31(626,-161) 32(641.7,161) 33(657.5,-161) 34(673.2,161) 35(689,-161) 36(704.7,161) 37(720,-161) 38(736.2,161) 39(752,-161) 40(767.7,161) 41(785,-161) 42(799.2,161) 43(815,-161) 44(830.7,161) 45(846.5,-161) 46(862.2,161) 47(878,-161) 48(893.7,161) 49(909.4,-161) 50(925.2,161) 51(940.9,-161) 52(956.7,161)
  rrect50% 177.17x196.85 hole 82.68 slot 102.36 at 90 deg mask+5: 53(15.75,917.32) 53(15.75,1891.73) 54(968.5,917.32) 54(968.5,1891.73)
  round 63 hole 63 mask+5: A(0,0)
  round 43 hole 43 mask+5: B(984.25,0)
  rect 90.55x126 smd mask+5: E(-85,-138) F(1069,-138)
  round 0 all layers, no hole: K(16,1892) L(969,1892)
Top Overlay:
  lines w7.87: 320.55,150.55 320.55,171 ; 360.55,150 360.55,171
  lines w8: -98,-209 1083,-209 ; -98,-68 -98,1785 ; -98,190 -62,190 -62,150 22,150 ; -98,1976.38 -98,2006 -70.87,2006 ; -33,-190 -29,-190 -29,-150 7,-150 ; 114.17,2006 881.89,2006 ; 267,-150 386,-150 ; 283,150 320,150 ; 320.55,171 cw(c340.55,170.2) 360.55,171 ; 341,-209 341,2007 ; 360.55,150 402,150 ; 959,-150 1012,-150 1012,-190 1016,-190 ; 976,150 1051,150 1051,190 1083,190 ; 1055.12,2006 1083,2006 1083,1976.38 ; 1083,-70 1083,1785
M1_3D_TOP:
  circle w8: c968.76,1892 r51.01
  circle w8: c16.25,1892 r51.01
  circle w8: c968.5,917.32 r51.01
  circle w8: c16,917.32 r51.01
  lines w1: 16,852.32 16,980.32 ; 16.25,1827 16.25,1955 ; 968.5,852.32 968.5,980.32 ; 968.76,1827 968.76,1955 ; -104,-193 -104,2012 1088,2012 1088,-193 -104,-193
  lines w8: -98,2006 1083,2006 ; 27,-190 27,-150 ; 43,151 43,197 ; 59,-189 59,-151 ; 75,151 75,197 ; 91,-189 91,-151 ; 106,150 106,197 ; 122,-189 122,-150 ; 138,150 138,197 ; 153,-190 153,-150 ; 169,150 169,197 ; 185,-190 185,-150 ; 201,150 201,197 ; 216,-189 216,-150 ; 232,150 232,197 ; 248,-189 248,-150 ; 264,150 264,197 ; 406,-189 406,-150 ; 421,150 421,197 ; 437,-189 437,-150 ; 453,150 453,197 ; 468,-189 468,-150 ; 484,150 484,197 ; 500,-189 500,-150 ; 516,150 516,197 ; 532,-190 532,-150 ; 547,150 547,197 ; 563,-189 563,-150 ; 579,151 579,197 ; 595,-189 595,-150 ; 610,150 610,197 ; 626,-189 626,-150 ; 642,151 642,197 ; 658,-190 658,-150 ; 673,150 673,197 ; 689,-189 689,-151 ; 704,150 704,197 ; 720,-189 720,-150 ; 736,150 736,197 ; 752,-189 752,-150 ; 768,150 768,197 ; 785,-189 785,-150 ; 799,150 799,197 ; 815,-189 815,-150 ; 831,150 831,197 ; 846,-189 846,-150 ; 862,150 862,197 ; 878,-189 878,-150 ; 894,150 894,197 ; 909,-189 909,-150 ; 925,150 925,197 ; 941,-189 941,-150 ; 956,150 956,197 ; -98,-209 1083,-209 1083,2003.94 -98,2003.94 -98,-209 ; -98,-190 -98,190 -62,190 -62,150 320,150 320,170 cw(c340,170.1) 360,170 360,150 1051,150 1051,190 1083,190 1083,-190 1012,-190 1012,-150 -29,-150 -29,-190 -98,-190
3D body "c-2041119-1-c-3d.stp": height 159.45, standoff -23.62, extent -96.45,-181.1 1080.71,176.77
3D body "PCI Express Half-Mini Card.step": height 291.34, standoff 104.33, extent -98.42,-23.62 1082.68,1031.5
3D body: height 157.87, standoff 0.39, extent 899.95,1823.13 1037.66,1960.88
3D body "emile_maurin_394112X4.stp": height 270.83, standoff 47.24, extent 889.77,1813 1047.25,1970.48
3D body "emile_maurin_394112X4.stp": height 98.43, standoff -125.16, extent 890.02,1813.26 1047.5,1970.74
3D body "emile_maurin_394112X4.stp": height 98.43, standoff -125.16, extent -62.48,1813.26 95,1970.74
3D body "emile_maurin_394112X4.stp": height 270.83, standoff 47.24, extent -62.73,1813 94.74,1970.48
3D body: height 157.87, standoff 0.39, extent -52.56,1823.13 85.15,1960.88
3D body: height 157.87, standoff 0.39, extent 899.69,848.45 1037.4,986.21
3D body "emile_maurin_394112X4.stp": height 270.83, standoff 47.24, extent 889.52,838.32 1047,995.8
3D body "emile_maurin_394112X4.stp": height 98.43, standoff -125.16, extent 889.77,838.59 1047.25,996.07
3D body "emile_maurin_394112X4.stp": height 98.43, standoff -125.16, extent -62.73,838.59 94.75,996.07
3D body "emile_maurin_394112X4.stp": height 270.83, standoff 47.24, extent -62.99,838.32 94.49,995.8
3D body: height 157.87, standoff 0.39, extent -52.81,848.45 84.9,986.21

## USB2A-J [mil] "au-y1008-2"
height 1
pads (12):
  round 63 hole 38 mask+5: A1(-137.8,0) A2(-39.37,0) A3(39.37,0) A4(137.8,0) B1(-137.8,103.15) B2(-39.37,103.15) B3(39.37,103.15) B4(137.8,103.15)
  round 124 hole 100 mask+5: G1(-258.66,-106.69) G2(258.66,-106.69) G3(-258.66,116.93) G4(258.66,116.93)
Top Overlay:
  lines w7.87: -285,-503.94 -295.28,-503.94 -295.28,-511.81 -285,-511.81 ; -285,-200 -285,-511.81 ; 285,-503.94 295.28,-503.94 295.28,-511.81 285,-511.81 ; 285,-200 285,-511.81 ; -285,-511.81 285,-511.81
  lines w10: -285,-33 -285,46 ; -200,170 200,170 ; 285,-30 285,46
M1_3D_TOP:
  lines w1: -285,-511.81 -284.1,170 285,170 285,-511.81 -285,-511.81
  lines w8: 285,-32 285,46 ; -285,-511.81 285,-511.81 285,170 -285,170 -285,-511.81
3D body "c-5787617-1-c-3d.stp": height 621.06, standoff -172.05, extent -319.66,-510 319.66,166.38

## USB2A-J - duplicate [mil] "au-y1008-2"
height 1
pads (12):
  round 63 hole 38 mask+5: A1(-137.8,0) A2(-39.37,0) A3(39.37,0) A4(137.8,0) B1(-137.8,103.15) B2(-39.37,103.15) B3(39.37,103.15) B4(137.8,103.15)
  round 124 hole 100 mask+5: G1(-258.66,-106.69) G2(258.66,-106.69) G3(-258.66,116.93) G4(258.66,116.93)
Top Overlay:
  lines w7.87: -285,-503.94 -295.28,-503.94 -295.28,-511.81 -285,-511.81 ; -285,-200 -285,-511.81 ; 285,-503.94 295.28,-503.94 295.28,-511.81 285,-511.81 ; 285,-200 285,-511.81 ; -285,-511.81 285,-511.81
  lines w10: -285,-33 -285,46 ; -200,170 200,170 ; 285,-30 285,46
M1_3D_TOP:
  lines w1: -285,-511.81 285,-511.81 285,170 -284.1,170 -285,-511.81
  lines w8: 285,-32 285,46 ; -285,-511.81 -285,170 285,170 285,-511.81 -285,-511.81
3D body "c-5787617-1-c-3d.stp": height 621.06, standoff -172.05, extent -319.66,-510 319.66,166.38

## USB2A-J_old [mil]
height 1
pads (12):
  round 63 hole 38 mask+5: A1(-138,0) A2(-39,0) A3(39,0) A4(138,0) B1(-138,104) B2(-39,104) B3(39,104) B4(138,104)
  round 124 hole 100 mask+5: G1(-259,-107) G2(259,-107) G3(-259,117) G4(259,117)
Top Overlay:
  lines w7.87: -285,-503.94 -295.28,-503.94 -295.28,-511.81 -285,-511.81 ; -285,-200 -285,-511.81 ; 285,-503.94 295.28,-503.94 295.28,-511.81 285,-511.81 ; 285,-200 285,-511.81 ; -285,-511.81 285,-511.81
  lines w10: -285,-33 -285,46 ; -200,170 200,170 ; 285,-30 285,46
M1_3D_TOP:
  lines w1: -285,-511.81 285,-511.81 285,170 -284.1,170 -285,-511.81
  lines w8: 285,-32 285,46 ; -285,-511.81 -285,170 285,170 285,-511.81 -285,-511.81
3D body "c-5787617-1-c-3d.stp": height 621.06, standoff -172.05, extent -319.66,-510 319.66,166.38

## USB2A-J_old - duplicate [mil]
height 1
pads (12):
  round 63 hole 38 mask+5: A1(-138,0) A2(-39,0) A3(39,0) A4(138,0) B1(-138,104) B2(-39,104) B3(39,104) B4(138,104)
  round 124 hole 100 mask+5: G1(-259,-107) G2(259,-107) G3(-259,117) G4(259,117)
Top Overlay:
  lines w7.87: -285,-503.94 -295.28,-503.94 -295.28,-511.81 -285,-511.81 ; -285,-200 -285,-511.81 ; 285,-503.94 295.28,-503.94 295.28,-511.81 285,-511.81 ; 285,-200 285,-511.81 ; -285,-511.81 285,-511.81
  lines w10: -285,-33 -285,46 ; -200,170 200,170 ; 285,-30 285,46
M1_3D_TOP:
  lines w1: -285,-511.81 285,-511.81 285,170 -284.1,170 -285,-511.81
  lines w8: 285,-32 285,46 ; -285,-511.81 -285,170 285,170 285,-511.81 -285,-511.81
3D body "c-5787617-1-c-3d.stp": height 621.06, standoff -172.05, extent -319.66,-510 319.66,166.38